# Altium schematic symbol library MCU_Microchip_ATmega.SchLib: 440 symbols (part 6 of 7) (continued)
## ATxmega128A3U-A
designator *  value ATxmega128A3U-A  Reference: U
ki_keywords: AVR 8/16bit Microcontroller XMegaAVR; ki_description: 32MHz, 128kB Flash, 8kB Boot, 8kB SRAM, 2kB EEPROM, JTAG, USB, TQFP-64; ki_fp_filters: TQFP*14x14mm*P0.8mm*; Footprint: Package_QFP:TQFP-64_14x14mm_P0.8mm; Datasheet: http://ww1.microchip.com/downloads/en/DeviceDoc/Atmel-8386-8-and-16-bit-AVR-Microcontroller-ATxmega64A3U-128A3U-192A3U-256A3U_datasheet.pdf
pins: 1 PA3, 2 PA4, 3 PA5, 4 PA6, 5 PA7, 6 AREFB/PB0, 7 PB1, 8 PB2, 9 PB3, 10 PB4, 11 PB5, 12 PB6, 13 PB7, 14 GND, 15 VCC, 16 PC0, 17 PC1, 18 PC2, 19 PC3, 20 PC4, 21 PC5, 22 PC6, 23 PC7, 24 GND hidden, 25 VCC hidden, 26 PD0, 27 PD1, 28 PD2, 29 PD3, 30 PD4, 31 PD5, 32 PD6, 33 PD7, 34 GND hidden, 35 VCC hidden, 36 PE0, 37 PE1, 38 PE2, 39 PE3, 40 PE4, 41 PE5, 42 PE6, 43 PE7, 44 GND hidden, 45 VCC hidden, 46 PF0, 47 PF1, 48 PF2, 49 PF3, 50 PF4, 51 PF5, 52 GND hidden, 53 VCC hidden, 54 PF6, 55 PF7, 56 PDI_DATA, 57 ~{{RESET}/PDI_CLK}, 58 PR0/XTAL2, 59 PR1/XTAL1, 60 GND hidden, 61 AVCC, 62 AREFA/PA0, 63 PA1, 64 PA2

## ATxmega128A3U-M
designator *  value ATxmega128A3U-M  Reference: U
ki_keywords: AVR 8/16bit Microcontroller XMegaAVR; ki_description: 32MHz, 128kB Flash, 8kB Boot, 8kB SRAM, 2kB EEPROM, JTAG, USB, QFN-64; ki_fp_filters: QFN*1EP*9x9mm*P0.5mm*; Footprint: Package_DFN_QFN:QFN-64-1EP_9x9mm_P0.5mm_EP7.65x7.65mm; Datasheet: http://ww1.microchip.com/downloads/en/DeviceDoc/Atmel-8386-8-and-16-bit-AVR-Microcontroller-ATxmega64A3U-128A3U-192A3U-256A3U_datasheet.pdf
pins: 1 PA3, 2 PA4, 3 PA5, 4 PA6, 5 PA7, 6 AREFB/PB0, 7 PB1, 8 PB2, 9 PB3, 10 PB4, 11 PB5, 12 PB6, 13 PB7, 14 GND, 15 VCC, 16 PC0, 17 PC1, 18 PC2, 19 PC3, 20 PC4, 21 PC5, 22 PC6, 23 PC7, 24 GND hidden, 25 VCC hidden, 26 PD0, 27 PD1, 28 PD2, 29 PD3, 30 PD4, 31 PD5, 32 PD6, 33 PD7, 34 GND hidden, 35 VCC hidden, 36 PE0, 37 PE1, 38 PE2, 39 PE3, 40 PE4, 41 PE5, 42 PE6, 43 PE7, 44 GND hidden, 45 VCC hidden, 46 PF0, 47 PF1, 48 PF2, 49 PF3, 50 PF4, 51 PF5, 52 GND hidden, 53 VCC hidden, 54 PF6, 55 PF7, 56 PDI_DATA, 57 ~{{RESET}/PDI_CLK}, 58 PR0/XTAL2, 59 PR1/XTAL1, 60 GND hidden, 61 AVCC, 62 AREFA/PA0, 63 PA1, 64 PA2, 65 GND hidden

## ATxmega128A4U-A
designator *  value ATxmega128A4U-A  Reference: U
ki_keywords: AVR 8/16bit Microcontroller XMegaAVR; ki_description: 32MHz, 128kB Flash, 8kB Boot, 8kB SRAM, 2kB EEPROM, JTAG, USB, TQFP-44; ki_fp_filters: TQFP*10x10mm*P0.8mm*; Footprint: Package_QFP:TQFP-44_10x10mm_P0.8mm; Datasheet: http://ww1.microchip.com/downloads/en/DeviceDoc/Atmel-8387-8-and16-bit-AVR-Microcontroller-XMEGA-A4U_Datasheet.pdf
pins: 1 PA5, 2 PA6, 3 PA7, 4 AREFB/PB0, 5 PB1, 6 PB2, 7 PB3, 8 GND, 9 VCC, 10 PC0, 11 PC1, 12 PC2, 13 PC3, 14 PC4, 15 PC5, 16 PC6, 17 PC7, 18 GND hidden, 19 VCC hidden, 20 PD0, 21 PD1, 22 PD2, 23 PD3, 24 PD4, 25 PD5, 26 PD6, 27 PD7, 28 PE0, 29 PE1, 30 GND hidden, 31 VCC hidden, 32 PE2, 33 PE3, 34 PDI_DATA, 35 ~{{RESET}/PDI_CLK}, 36 PR0/XTAL2, 37 PR1/XTAL1, 38 GND hidden, 39 AVCC, 40 AREFA/PA0, 41 PA1, 42 PA2, 43 PA3, 44 PA4

## ATxmega128A4U-C
designator *  value ATxmega128A4U-C  Reference: U
ki_keywords: AVR 8/16bit Microcontroller XMegaAVR; ki_description: 32MHz, 128kB Flash, 8kB Boot, 8kB SRAM, 2kB EEPROM, JTAG, USB, VFBGA-49; ki_fp_filters: VFBGA*5.0x5.0mm*Layout7x7*P0.65mm*; Footprint: Package_BGA:VFBGA-49_5.0x5.0mm_Layout7x7_P0.65mm; Datasheet: http://ww1.microchip.com/downloads/en/DeviceDoc/Atmel-8387-8-and16-bit-AVR-Microcontroller-XMEGA-A4U_Datasheet.pdf
pins: A1 PA3, A2 AVCC, A3 GND, A4 PR1/XTAL1, A5 PR0/XTAL2, A6 PDI_DATA, A7 PE3, B1 PA4, B2 PA1, B3 AREFA/PA0, B4 GND hidden, B5 ~{{RESET}/PDI_CLK}, B6 PE2, B7 VCC, C1 PA5, C2 PA2, C3 PA6, C4 PA7, C5 GND hidden, C6 PE1, C7 GND hidden, D1 PB1, D2 PB2, D3 PB3, D4 AREFB/PB0, D5 GND hidden, D6 PD7, D7 PE0, E1 GND hidden, E2 GND hidden, E3 PC3, E4 GND hidden, E5 PD4, E6 PD5, E7 PD6, F1 VCC hidden, F2 PC0, F3 PC4, F4 PC6, F5 PD0, F6 PD1, F7 PD3, G1 PC1, G2 PC2, G3 PC5, G4 PC7, G5 GND hidden, G6 VCC hidden, G7 PD2

## ATxmega128A4U-M
designator *  value ATxmega128A4U-M  Reference: U
ki_keywords: AVR 8/16bit Microcontroller XMegaAVR; ki_description: 32MHz, 128kB Flash, 8kB Boot, 8kB SRAM, 2kB EEPROM, JTAG, USB, QFN-44; ki_fp_filters: QFN*1EP*7x7mm*P0.5mm*; Footprint: Package_DFN_QFN:QFN-44-1EP_7x7mm_P0.5mm_EP5.2x5.2mm; Datasheet: http://ww1.microchip.com/downloads/en/DeviceDoc/Atmel-8387-8-and16-bit-AVR-Microcontroller-XMEGA-A4U_Datasheet.pdf
pins: 1 PA5, 2 PA6, 3 PA7, 4 AREFB/PB0, 5 PB1, 6 PB2, 7 PB3, 8 GND, 9 VCC, 10 PC0, 11 PC1, 12 PC2, 13 PC3, 14 PC4, 15 PC5, 16 PC6, 17 PC7, 18 GND hidden, 19 VCC hidden, 20 PD0, 21 PD1, 22 PD2, 23 PD3, 24 PD4, 25 PD5, 26 PD6, 27 PD7, 28 PE0, 29 PE1, 30 GND hidden, 31 VCC hidden, 32 PE2, 33 PE3, 34 PDI_DATA, 35 ~{{RESET}/PDI_CLK}, 36 PR0/XTAL2, 37 PR1/XTAL1, 38 GND hidden, 39 AVCC, 40 AREFA/PA0, 41 PA1, 42 PA2, 43 PA3, 44 PA4, 45 GND hidden

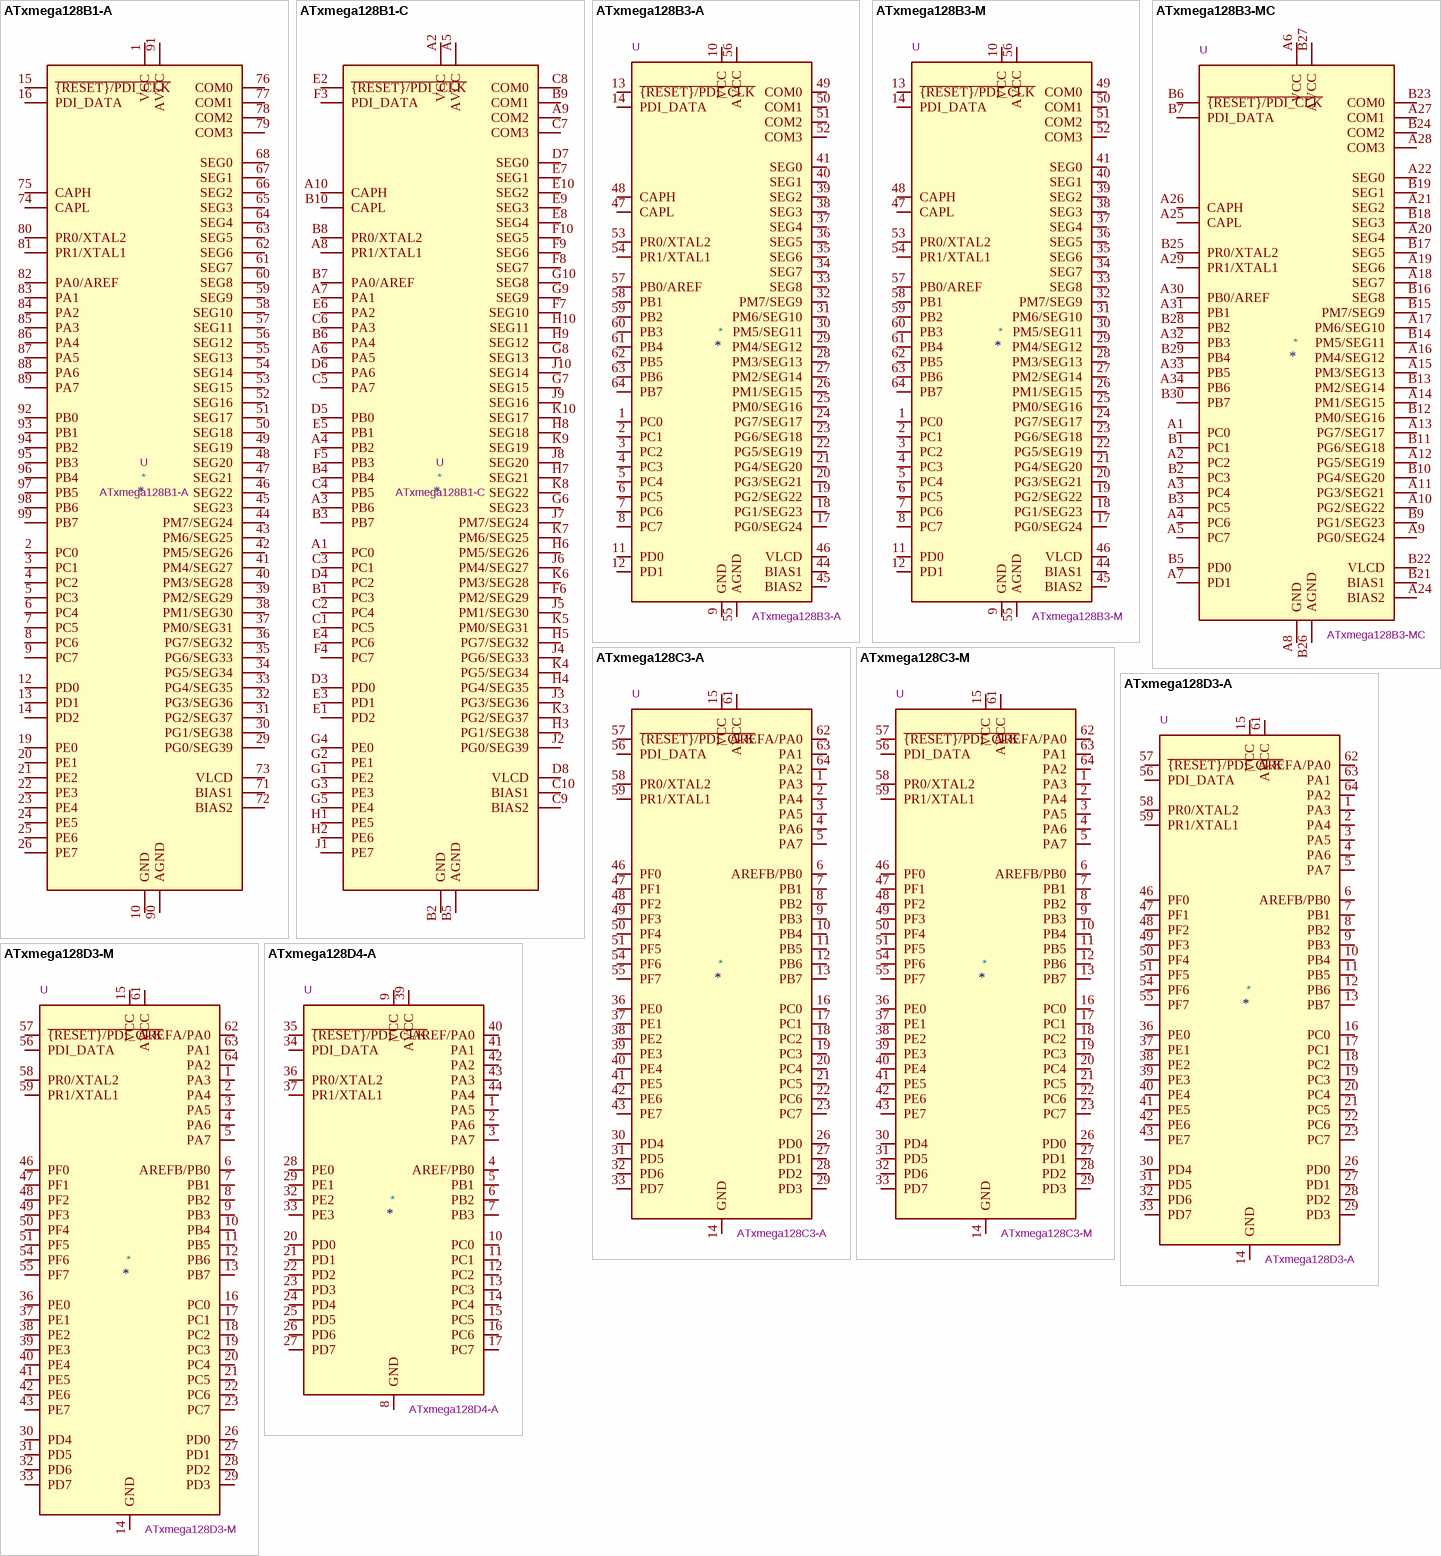
[diagram p37: symbols ATxmega128B1-A to ATxmega128D4-A]

## ATxmega128B1-A
designator *  value ATxmega128B1-A  Reference: U
ki_keywords: AVR 8/16bit Microcontroller XMegaAVR; ki_description: 32MHz, 128kB Flash, 8kB Boot, 8kB SRAM, 2kB EEPROM, JTAG, USB, LCD, TQFP-100; ki_fp_filters: TQFP*14x14mm*P0.5mm*; Footprint: Package_QFP:TQFP-100_14x14mm_P0.5mm; Datasheet: http://ww1.microchip.com/downloads/en/DeviceDoc/Atmel-8330-8-and-16-bit-AVR-Microcontroller-XMEGA-B-ATxmega64B1-ATxmega128B1_Datasheet.pdf
pins: 1 VCC, 2 PC0, 3 PC1, 4 PC2, 5 PC3, 6 PC4, 7 PC5, 8 PC6, 9 PC7, 10 GND, 11 VCC hidden, 12 PD0, 13 PD1, 14 PD2, 15 ~{{RESET}/PDI_CLK}, 16 PDI_DATA, 17 GND hidden, 18 VCC hidden, 19 PE0, 20 PE1, 21 PE2, 22 PE3, 23 PE4, 24 PE5, 25 PE6, 26 PE7, 27 GND hidden, 28 VCC hidden, 29 PG0/SEG39, 30 PG1/SEG38, 31 PG2/SEG37, 32 PG3/SEG36, 33 PG4/SEG35, 34 PG5/SEG34, 35 PG6/SEG33, 36 PG7/SEG32, 37 PM0/SEG31, 38 PM1/SEG30, 39 PM2/SEG29, 40 PM3/SEG28, 41 PM4/SEG27, 42 PM5/SEG26, 43 PM6/SEG25, 44 PM7/SEG24, 45 SEG23, 46 SEG22, 47 SEG21, 48 SEG20, 49 SEG19, 50 SEG18, 51 SEG17, 52 SEG16, 53 SEG15, 54 SEG14, 55 SEG13, 56 SEG12, 57 SEG11, 58 SEG10, 59 SEG9, 60 SEG8, 61 SEG7, 62 SEG6, 63 SEG5, 64 SEG4, 65 SEG3, 66 SEG2, 67 SEG1, 68 SEG0, 69 GND hidden, 70 VCC hidden, 71 BIAS1, 72 BIAS2, 73 VLCD, 74 CAPL, 75 CAPH, 76 COM0, 77 COM1, 78 COM2, 79 COM3, 80 PR0/XTAL2, 81 PR1/XTAL1, 82 PA0/AREF, 83 PA1, 84 PA2, 85 PA3, 86 PA4, 87 PA5, 88 PA6, 89 PA7, 90 AGND, 91 AVCC, 92 PB0, 93 PB1, 94 PB2, 95 PB3, 96 PB4, 97 PB5, 98 PB6, 99 PB7, 100 GND hidden

## ATxmega128B1-C
designator *  value ATxmega128B1-C  Reference: U
ki_keywords: AVR 8/16bit Microcontroller XMegaAVR; ki_description: 32MHz, 128kB Flash, 8kB Boot, 8kB SRAM, 2kB EEPROM, JTAG, USB, LCD, VFBGA-100; ki_fp_filters: VFBGA*7.0x7.0mm*Layout10x10*P0.65mm*; Footprint: Package_BGA:VFBGA-100_7.0x7.0mm_Layout10x10_P0.65mm; Datasheet: http://ww1.microchip.com/downloads/en/DeviceDoc/Atmel-8330-8-and-16-bit-AVR-Microcontroller-XMEGA-B-ATxmega64B1-ATxmega128B1_Datasheet.pdf
pins: A1 PC0, A2 VCC, A3 PB6, A4 PB2, A5 AVCC, A6 PA5, A7 PA1, A8 PR1/XTAL1, A9 COM2, A10 CAPH, B1 PC3, B2 GND, B3 PB7, B4 PB4, B5 AGND, B6 PA4, B7 PA0/AREF, B8 PR0/XTAL2, B9 COM1, B10 CAPL, C1 PC5, C2 PC4, C3 PC1, C4 PB5, C5 PA7, C6 PA3, C7 COM3, C8 COM0, C9 BIAS2, C10 BIAS1, D1 VCC hidden, D2 GND hidden, D3 PD0, D4 PC2, D5 PB0, D6 PA6, D7 SEG0, D8 VLCD, D9 GND hidden, D10 VCC hidden, E1 PD2, E2 ~{{RESET}/PDI_CLK}, E3 PD1, E4 PC6, E5 PB1, E6 PA2, E7 SEG1, E8 SEG4, E9 SEG3, E10 SEG2, F1 VCC hidden, F2 GND hidden, F3 PDI_DATA, F4 PC7, F5 PB3, F6 PM2/SEG29, F7 SEG10, F8 SEG7, F9 SEG6, F10 SEG5, G1 PE2, G2 PE1, G3 PE3, G4 PE0, G5 PE4, G6 SEG23, G7 SEG15, G8 SEG13, G9 SEG9, G10 SEG8, H1 PE5, H2 PE6, H3 PG1/SEG38, H4 PG4/SEG35, H5 PG7/SEG32, H6 PM5/SEG26, H7 SEG21, H8 SEG18, H9 SEG12, H10 SEG11, J1 PE7, J2 PG0/SEG39, J3 PG3/SEG36, J4 PG6/SEG33, J5 PM1/SEG30, J6 PM4/SEG27, J7 PM7/SEG24, J8 SEG20, J9 SEG16, J10 SEG14, K1 GND hidden, K2 VCC hidden, K3 PG2/SEG37, K4 PG5/SEG34, K5 PM0/SEG31, K6 PM3/SEG28, K7 PM6/SEG25, K8 SEG22, K9 SEG19, K10 SEG17

## ATxmega128B3-A
designator *  value ATxmega128B3-A  Reference: U
ki_keywords: AVR 8/16bit Microcontroller XMegaAVR; ki_description: 32MHz, 128kB Flash, 8kB Boot, 8kB SRAM, 2kB EEPROM, JTAG, USB, LCD, TQFP-64; ki_fp_filters: TQFP*14x14mm*P0.8mm*; Footprint: Package_QFP:TQFP-64_14x14mm_P0.8mm; Datasheet: http://ww1.microchip.com/downloads/en/DeviceDoc/Atmel-8074-8-and-16-bit-AVR-Microcontroller-XMEGA-B-ATxmega64B3-ATxmega128B3_Datasheet.pdf
pins: 1 PC0, 2 PC1, 3 PC2, 4 PC3, 5 PC4, 6 PC5, 7 PC6, 8 PC7, 9 GND, 10 VCC, 11 PD0, 12 PD1, 13 ~{{RESET}/PDI_CLK}, 14 PDI_DATA, 15 GND hidden, 16 VCC hidden, 17 PG0/SEG24, 18 PG1/SEG23, 19 PG2/SEG22, 20 PG3/SEG21, 21 PG4/SEG20, 22 PG5/SEG19, 23 PG6/SEG18, 24 PG7/SEG17, 25 PM0/SEG16, 26 PM1/SEG15, 27 PM2/SEG14, 28 PM3/SEG13, 29 PM4/SEG12, 30 PM5/SEG11, 31 PM6/SEG10, 32 PM7/SEG9, 33 SEG8, 34 SEG7, 35 SEG6, 36 SEG5, 37 SEG4, 38 SEG3, 39 SEG2, 40 SEG1, 41 SEG0, 42 GND hidden, 43 VCC hidden, 44 BIAS1, 45 BIAS2, 46 VLCD, 47 CAPL, 48 CAPH, 49 COM0, 50 COM1, 51 COM2, 52 COM3, 53 PR0/XTAL2, 54 PR1/XTAL1, 55 AGND, 56 AVCC, 57 PB0/AREF, 58 PB1, 59 PB2, 60 PB3, 61 PB4, 62 PB5, 63 PB6, 64 PB7

## ATxmega128B3-M
designator *  value ATxmega128B3-M  Reference: U
ki_keywords: AVR 8/16bit Microcontroller XMegaAVR; ki_description: 32MHz, 128kB Flash, 8kB Boot, 8kB SRAM, 2kB EEPROM, JTAG, USB, LCD, QFN-64; ki_fp_filters: QFN*1EP*9x9mm*P0.5mm*; Footprint: Package_DFN_QFN:QFN-64-1EP_9x9mm_P0.5mm_EP7.65x7.65mm; Datasheet: http://ww1.microchip.com/downloads/en/DeviceDoc/Atmel-8074-8-and-16-bit-AVR-Microcontroller-XMEGA-B-ATxmega64B3-ATxmega128B3_Datasheet.pdf
pins: 1 PC0, 2 PC1, 3 PC2, 4 PC3, 5 PC4, 6 PC5, 7 PC6, 8 PC7, 9 GND, 10 VCC, 11 PD0, 12 PD1, 13 ~{{RESET}/PDI_CLK}, 14 PDI_DATA, 15 GND hidden, 16 VCC hidden, 17 PG0/SEG24, 18 PG1/SEG23, 19 PG2/SEG22, 20 PG3/SEG21, 21 PG4/SEG20, 22 PG5/SEG19, 23 PG6/SEG18, 24 PG7/SEG17, 25 PM0/SEG16, 26 PM1/SEG15, 27 PM2/SEG14, 28 PM3/SEG13, 29 PM4/SEG12, 30 PM5/SEG11, 31 PM6/SEG10, 32 PM7/SEG9, 33 SEG8, 34 SEG7, 35 SEG6, 36 SEG5, 37 SEG4, 38 SEG3, 39 SEG2, 40 SEG1, 41 SEG0, 42 GND hidden, 43 VCC hidden, 44 BIAS1, 45 BIAS2, 46 VLCD, 47 CAPL, 48 CAPH, 49 COM0, 50 COM1, 51 COM2, 52 COM3, 53 PR0/XTAL2, 54 PR1/XTAL1, 55 AGND, 56 AVCC, 57 PB0/AREF, 58 PB1, 59 PB2, 60 PB3, 61 PB4, 62 PB5, 63 PB6, 64 PB7, 65 GND hidden

## ATxmega128B3-MC
designator *  value ATxmega128B3-MC  Reference: U
ki_keywords: AVR 8/16bit Microcontroller XMegaAVR; ki_description: 32MHz, 128kB Flash, 8kB Boot, 8kB SRAM, 2kB EEPROM, JTAG, USB, LCD, DRQFN-64; ki_fp_filters: Microchip*DRQFN*1EP*7x7mm*P0.65mm*; Footprint: Package_DFN_QFN:Microchip_DRQFN-64-1EP_7x7mm_P0.65mm_EP4.1x4.1mm; Datasheet: http://ww1.microchip.com/downloads/en/DeviceDoc/Atmel-8074-8-and-16-bit-AVR-Microcontroller-XMEGA-B-ATxmega64B3-ATxmega128B3_Datasheet.pdf
pins: A1 PC0, A2 PC2, A3 PC4, A4 PC6, A5 PC7, A6 VCC, A7 PD1, A8 GND, A9 PG0/SEG24, A10 PG2/SEG22, A11 PG3/SEG21, A12 PG5/SEG19, A13 PG7/SEG17, A14 PM1/SEG15, A15 PM3/SEG13, A16 PM4/SEG12, A17 PM6/SEG10, A18 SEG7, A19 SEG6, A20 SEG4, A21 SEG2, A22 SEG0, A23 VCC hidden, A24 BIAS2, A25 CAPL, A26 CAPH, A27 COM1, A28 COM3, A29 PR1/XTAL1, A30 PB0/AREF, A31 PB1, A32 PB3, A33 PB5, A34 PB6, B1 PC1, B2 PC3, B3 PC5, B4 GND hidden, B5 PD0, B6 ~{{RESET}/PDI_CLK}, B7 PDI_DATA, B8 VCC hidden, B9 PG1/SEG23, B10 PG4/SEG20, B11 PG6/SEG18, B12 PM0/SEG16, B13 PM2/SEG14, B14 PM5/SEG11, B15 PM7/SEG9, B16 SEG8, B17 SEG5, B18 SEG3, B19 SEG1, B20 GND hidden, B21 BIAS1, B22 VLCD, B23 COM0, B24 COM2, B25 PR0/XTAL2, B26 AGND, B27 AVCC, B28 PB2, B29 PB4, B30 PB7, EP GND hidden

## ATxmega128C3-A
designator *  value ATxmega128C3-A  Reference: U
ki_keywords: AVR 8/16bit Microcontroller XMegaAVR; ki_description: 32MHz, 128kB Flash, 8kB Boot, 8kB SRAM, 2kB EEPROM, JTAG, USB, TQFP-64; ki_fp_filters: TQFP*14x14mm*P0.8mm*; Footprint: Package_QFP:TQFP-64_14x14mm_P0.8mm; Datasheet: http://ww1.microchip.com/downloads/en/DeviceDoc/Atmel-8492-8-and-16-bit-AVR-microcontroller-ATxmega32C3_64C3_128C3_192C3_256C3_datasheet.pdf
pins: 1 PA3, 2 PA4, 3 PA5, 4 PA6, 5 PA7, 6 AREFB/PB0, 7 PB1, 8 PB2, 9 PB3, 10 PB4, 11 PB5, 12 PB6, 13 PB7, 14 GND, 15 VCC, 16 PC0, 17 PC1, 18 PC2, 19 PC3, 20 PC4, 21 PC5, 22 PC6, 23 PC7, 24 GND hidden, 25 VCC hidden, 26 PD0, 27 PD1, 28 PD2, 29 PD3, 30 PD4, 31 PD5, 32 PD6, 33 PD7, 34 GND hidden, 35 VCC hidden, 36 PE0, 37 PE1, 38 PE2, 39 PE3, 40 PE4, 41 PE5, 42 PE6, 43 PE7, 44 GND hidden, 45 VCC hidden, 46 PF0, 47 PF1, 48 PF2, 49 PF3, 50 PF4, 51 PF5, 52 GND hidden, 53 VCC hidden, 54 PF6, 55 PF7, 56 PDI_DATA, 57 ~{{RESET}/PDI_CLK}, 58 PR0/XTAL2, 59 PR1/XTAL1, 60 GND hidden, 61 AVCC, 62 AREFA/PA0, 63 PA1, 64 PA2

## ATxmega128C3-M
designator *  value ATxmega128C3-M  Reference: U
ki_keywords: AVR 8/16bit Microcontroller XMegaAVR; ki_description: 32MHz, 128kB Flash, 8kB Boot, 8kB SRAM, 2kB EEPROM, JTAG, USB, QFN-64; ki_fp_filters: QFN*1EP*9x9mm*P0.5mm*; Footprint: Package_DFN_QFN:QFN-64-1EP_9x9mm_P0.5mm_EP7.65x7.65mm; Datasheet: http://ww1.microchip.com/downloads/en/DeviceDoc/Atmel-8492-8-and-16-bit-AVR-microcontroller-ATxmega32C3_64C3_128C3_192C3_256C3_datasheet.pdf
pins: 1 PA3, 2 PA4, 3 PA5, 4 PA6, 5 PA7, 6 AREFB/PB0, 7 PB1, 8 PB2, 9 PB3, 10 PB4, 11 PB5, 12 PB6, 13 PB7, 14 GND, 15 VCC, 16 PC0, 17 PC1, 18 PC2, 19 PC3, 20 PC4, 21 PC5, 22 PC6, 23 PC7, 24 GND hidden, 25 VCC hidden, 26 PD0, 27 PD1, 28 PD2, 29 PD3, 30 PD4, 31 PD5, 32 PD6, 33 PD7, 34 GND hidden, 35 VCC hidden, 36 PE0, 37 PE1, 38 PE2, 39 PE3, 40 PE4, 41 PE5, 42 PE6, 43 PE7, 44 GND hidden, 45 VCC hidden, 46 PF0, 47 PF1, 48 PF2, 49 PF3, 50 PF4, 51 PF5, 52 GND hidden, 53 VCC hidden, 54 PF6, 55 PF7, 56 PDI_DATA, 57 ~{{RESET}/PDI_CLK}, 58 PR0/XTAL2, 59 PR1/XTAL1, 60 GND hidden, 61 AVCC, 62 AREFA/PA0, 63 PA1, 64 PA2, 65 GND hidden

## ATxmega128D3-A
designator *  value ATxmega128D3-A  Reference: U
ki_keywords: AVR 8/16bit Microcontroller XMegaAVR; ki_description: 32MHz, 128kB Flash, 8kB Boot, 8kB SRAM, 2kB EEPROM, JTAG, TQFP-64; ki_fp_filters: TQFP*14x14mm*P0.8mm*; Footprint: Package_QFP:TQFP-64_14x14mm_P0.8mm; Datasheet: http://ww1.microchip.com/downloads/en/DeviceDoc/Atmel-8134-8-16-bit-Atmel-XMEGA-D3-Microcontroller_Datasheet.pdf
pins: 1 PA3, 2 PA4, 3 PA5, 4 PA6, 5 PA7, 6 AREFB/PB0, 7 PB1, 8 PB2, 9 PB3, 10 PB4, 11 PB5, 12 PB6, 13 PB7, 14 GND, 15 VCC, 16 PC0, 17 PC1, 18 PC2, 19 PC3, 20 PC4, 21 PC5, 22 PC6, 23 PC7, 24 GND hidden, 25 VCC hidden, 26 PD0, 27 PD1, 28 PD2, 29 PD3, 30 PD4, 31 PD5, 32 PD6, 33 PD7, 34 GND hidden, 35 VCC hidden, 36 PE0, 37 PE1, 38 PE2, 39 PE3, 40 PE4, 41 PE5, 42 PE6, 43 PE7, 44 GND hidden, 45 VCC hidden, 46 PF0, 47 PF1, 48 PF2, 49 PF3, 50 PF4, 51 PF5, 52 GND hidden, 53 VCC hidden, 54 PF6, 55 PF7, 56 PDI_DATA, 57 ~{{RESET}/PDI_CLK}, 58 PR0/XTAL2, 59 PR1/XTAL1, 60 GND hidden, 61 AVCC, 62 AREFA/PA0, 63 PA1, 64 PA2

## ATxmega128D3-M
designator *  value ATxmega128D3-M  Reference: U
ki_keywords: AVR 8/16bit Microcontroller XMegaAVR; ki_description: 32MHz, 128kB Flash, 8kB Boot, 8kB SRAM, 2kB EEPROM, JTAG, QFN-64; ki_fp_filters: QFN*1EP*9x9mm*P0.5mm*; Footprint: Package_DFN_QFN:QFN-64-1EP_9x9mm_P0.5mm_EP7.65x7.65mm; Datasheet: http://ww1.microchip.com/downloads/en/DeviceDoc/Atmel-8134-8-16-bit-Atmel-XMEGA-D3-Microcontroller_Datasheet.pdf
pins: 1 PA3, 2 PA4, 3 PA5, 4 PA6, 5 PA7, 6 AREFB/PB0, 7 PB1, 8 PB2, 9 PB3, 10 PB4, 11 PB5, 12 PB6, 13 PB7, 14 GND, 15 VCC, 16 PC0, 17 PC1, 18 PC2, 19 PC3, 20 PC4, 21 PC5, 22 PC6, 23 PC7, 24 GND hidden, 25 VCC hidden, 26 PD0, 27 PD1, 28 PD2, 29 PD3, 30 PD4, 31 PD5, 32 PD6, 33 PD7, 34 GND hidden, 35 VCC hidden, 36 PE0, 37 PE1, 38 PE2, 39 PE3, 40 PE4, 41 PE5, 42 PE6, 43 PE7, 44 GND hidden, 45 VCC hidden, 46 PF0, 47 PF1, 48 PF2, 49 PF3, 50 PF4, 51 PF5, 52 GND hidden, 53 VCC hidden, 54 PF6, 55 PF7, 56 PDI_DATA, 57 ~{{RESET}/PDI_CLK}, 58 PR0/XTAL2, 59 PR1/XTAL1, 60 GND hidden, 61 AVCC, 62 AREFA/PA0, 63 PA1, 64 PA2, 65 GND hidden

## ATxmega128D4-A
designator *  value ATxmega128D4-A  Reference: U
ki_keywords: AVR 8/16bit Microcontroller XMegaAVR; ki_description: 32MHz, 128kB Flash, 8kB Boot, 8kB SRAM, 2kB EEPROM, JTAG, TQFP-44; ki_fp_filters: TQFP*10x10mm*P0.8mm*; Footprint: Package_QFP:TQFP-44_10x10mm_P0.8mm; Datasheet: http://ww1.microchip.com/downloads/en/DeviceDoc/Atmel-8135-8-and-16-bit-AVR-microcontroller-ATxmega16D4-32D4-64D4-128D4_datasheet.pdf
pins: 1 PA5, 2 PA6, 3 PA7, 4 AREF/PB0, 5 PB1, 6 PB2, 7 PB3, 8 GND, 9 VCC, 10 PC0, 11 PC1, 12 PC2, 13 PC3, 14 PC4, 15 PC5, 16 PC6, 17 PC7, 18 GND hidden, 19 VCC hidden, 20 PD0, 21 PD1, 22 PD2, 23 PD3, 24 PD4, 25 PD5, 26 PD6, 27 PD7, 28 PE0, 29 PE1, 30 GND hidden, 31 VCC hidden, 32 PE2, 33 PE3, 34 PDI_DATA, 35 ~{{RESET}/PDI_CLK}, 36 PR0/XTAL2, 37 PR1/XTAL1, 38 GND hidden, 39 AVCC, 40 AREF/PA0, 41 PA1, 42 PA2, 43 PA3, 44 PA4

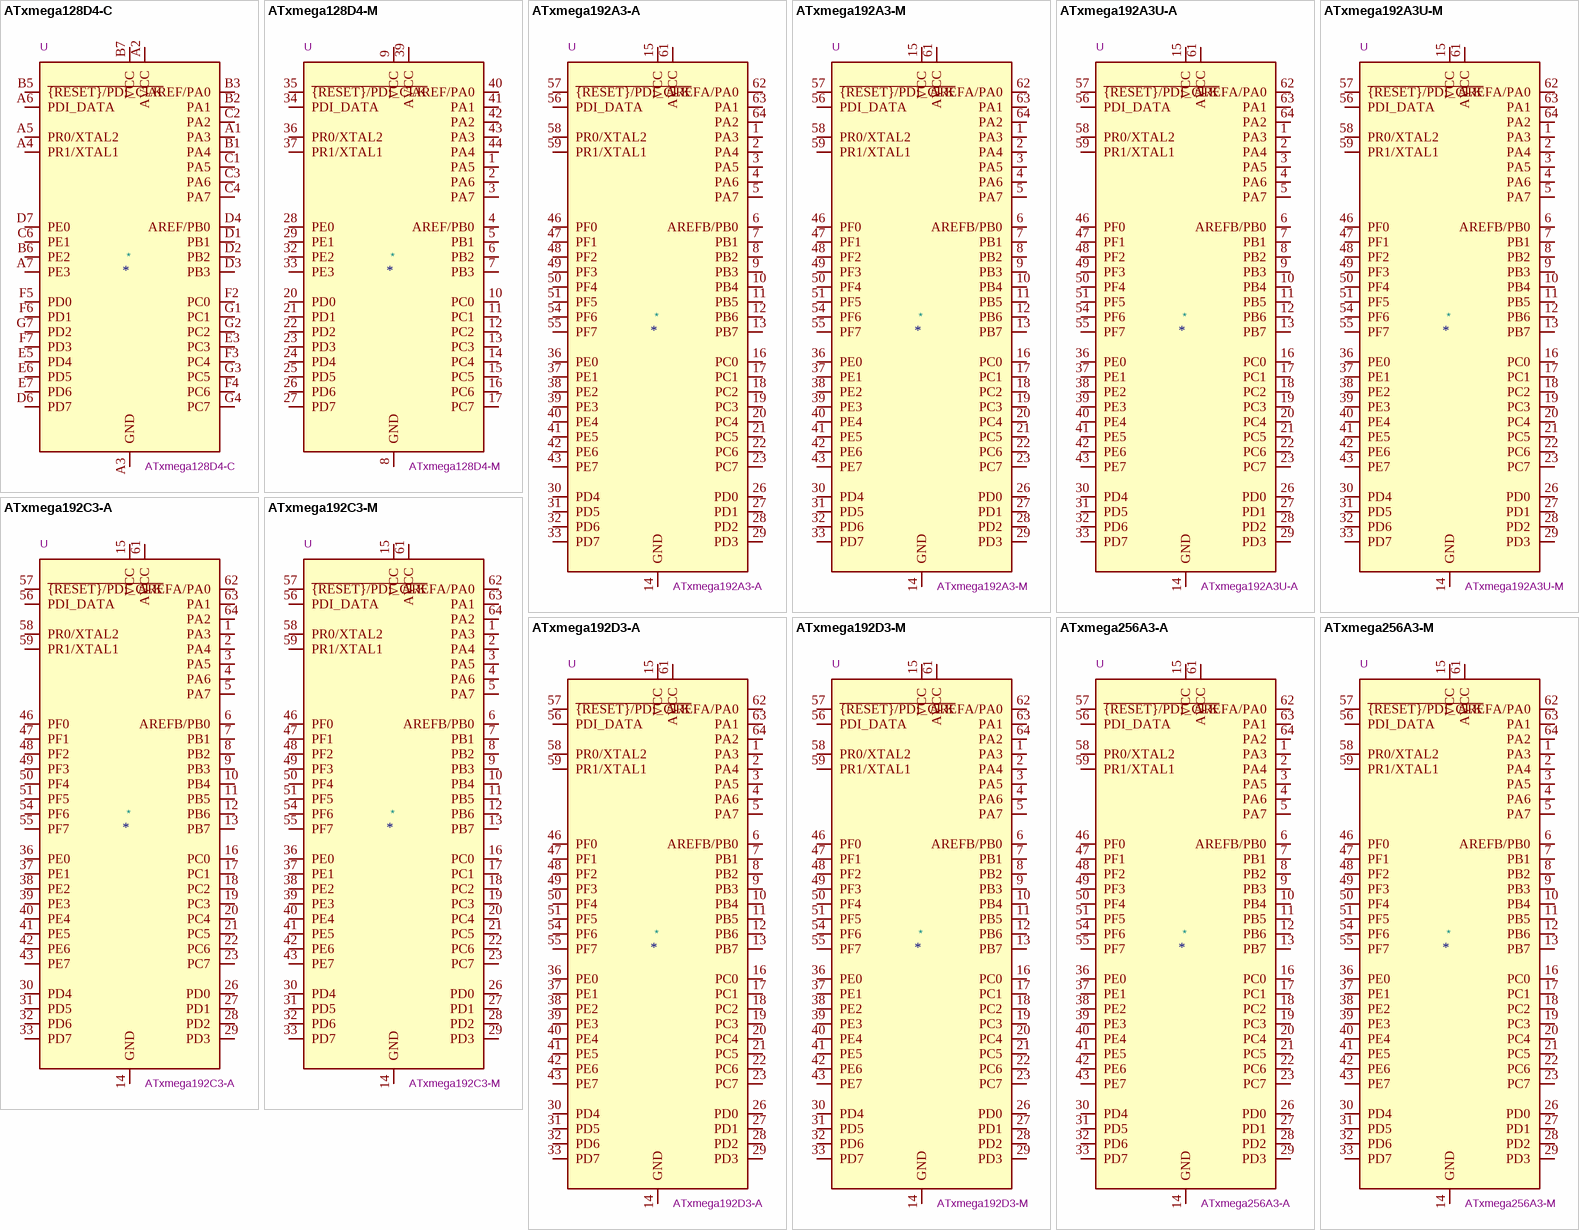
[diagram p38: symbols ATxmega128D4-C to ATxmega256A3-M]

## ATxmega128D4-C
designator *  value ATxmega128D4-C  Reference: U
ki_keywords: AVR 8/16bit Microcontroller XMegaAVR; ki_description: 32MHz, 128kB Flash, 8kB Boot, 8kB SRAM, 2kB EEPROM, JTAG, VFBGA-49; ki_fp_filters: VFBGA*5.0x5.0mm*Layout7x7*P0.65mm*; Footprint: Package_BGA:VFBGA-49_5.0x5.0mm_Layout7x7_P0.65mm; Datasheet: http://ww1.microchip.com/downloads/en/DeviceDoc/Atmel-8135-8-and-16-bit-AVR-microcontroller-ATxmega16D4-32D4-64D4-128D4_datasheet.pdf
pins: A1 PA3, A2 AVCC, A3 GND, A4 PR1/XTAL1, A5 PR0/XTAL2, A6 PDI_DATA, A7 PE3, B1 PA4, B2 PA1, B3 AREF/PA0, B4 GND hidden, B5 ~{{RESET}/PDI_CLK}, B6 PE2, B7 VCC, C1 PA5, C2 PA2, C3 PA6, C4 PA7, C5 GND hidden, C6 PE1, C7 GND hidden, D1 PB1, D2 PB2, D3 PB3, D4 AREF/PB0, D5 GND hidden, D6 PD7, D7 PE0, E1 GND hidden, E2 GND hidden, E3 PC3, E4 GND hidden, E5 PD4, E6 PD5, E7 PD6, F1 VCC hidden, F2 PC0, F3 PC4, F4 PC6, F5 PD0, F6 PD1, F7 PD3, G1 PC1, G2 PC2, G3 PC5, G4 PC7, G5 GND hidden, G6 VCC hidden, G7 PD2

## ATxmega128D4-M
designator *  value ATxmega128D4-M  Reference: U
ki_keywords: AVR 8/16bit Microcontroller XMegaAVR; ki_description: 32MHz, 128kB Flash, 8kB Boot, 8kB SRAM, 2kB EEPROM, JTAG, QFN-44; ki_fp_filters: QFN*1EP*7x7mm*P0.5mm*; Footprint: Package_DFN_QFN:QFN-44-1EP_7x7mm_P0.5mm_EP5.2x5.2mm; Datasheet: http://ww1.microchip.com/downloads/en/DeviceDoc/Atmel-8135-8-and-16-bit-AVR-microcontroller-ATxmega16D4-32D4-64D4-128D4_datasheet.pdf
pins: 1 PA5, 2 PA6, 3 PA7, 4 AREF/PB0, 5 PB1, 6 PB2, 7 PB3, 8 GND, 9 VCC, 10 PC0, 11 PC1, 12 PC2, 13 PC3, 14 PC4, 15 PC5, 16 PC6, 17 PC7, 18 GND hidden, 19 VCC hidden, 20 PD0, 21 PD1, 22 PD2, 23 PD3, 24 PD4, 25 PD5, 26 PD6, 27 PD7, 28 PE0, 29 PE1, 30 GND hidden, 31 VCC hidden, 32 PE2, 33 PE3, 34 PDI_DATA, 35 ~{{RESET}/PDI_CLK}, 36 PR0/XTAL2, 37 PR1/XTAL1, 38 GND hidden, 39 AVCC, 40 AREF/PA0, 41 PA1, 42 PA2, 43 PA3, 44 PA4, 45 GND hidden

## ATxmega192A3-A
designator *  value ATxmega192A3-A  Reference: U
ki_keywords: AVR 8/16bit Microcontroller XMegaAVR; ki_description: 32MHz, 192kB Flash, 8kB Boot, 16kB SRAM, 2kB EEPROM, JTAG, TQFP-64; ki_fp_filters: TQFP*14x14mm*P0.8mm*; Footprint: Package_QFP:TQFP-64_14x14mm_P0.8mm; Datasheet: http://ww1.microchip.com/downloads/en/DeviceDoc/Atmel-8068-8-and16-bit-AVR-XMEGA-A3-Microcontrollers_Datasheet.pdf
pins: 1 PA3, 2 PA4, 3 PA5, 4 PA6, 5 PA7, 6 AREFB/PB0, 7 PB1, 8 PB2, 9 PB3, 10 PB4, 11 PB5, 12 PB6, 13 PB7, 14 GND, 15 VCC, 16 PC0, 17 PC1, 18 PC2, 19 PC3, 20 PC4, 21 PC5, 22 PC6, 23 PC7, 24 GND hidden, 25 VCC hidden, 26 PD0, 27 PD1, 28 PD2, 29 PD3, 30 PD4, 31 PD5, 32 PD6, 33 PD7, 34 GND hidden, 35 VCC hidden, 36 PE0, 37 PE1, 38 PE2, 39 PE3, 40 PE4, 41 PE5, 42 PE6, 43 PE7, 44 GND hidden, 45 VCC hidden, 46 PF0, 47 PF1, 48 PF2, 49 PF3, 50 PF4, 51 PF5, 52 GND hidden, 53 VCC hidden, 54 PF6, 55 PF7, 56 PDI_DATA, 57 ~{{RESET}/PDI_CLK}, 58 PR0/XTAL2, 59 PR1/XTAL1, 60 GND hidden, 61 AVCC, 62 AREFA/PA0, 63 PA1, 64 PA2

## ATxmega192A3-M
designator *  value ATxmega192A3-M  Reference: U
ki_keywords: AVR 8/16bit Microcontroller XMegaAVR; ki_description: 32MHz, 192kB Flash, 8kB Boot, 16kB SRAM, 2kB EEPROM, JTAG, QFN-64; ki_fp_filters: QFN*1EP*9x9mm*P0.5mm*; Footprint: Package_DFN_QFN:QFN-64-1EP_9x9mm_P0.5mm_EP7.65x7.65mm; Datasheet: http://ww1.microchip.com/downloads/en/DeviceDoc/Atmel-8068-8-and16-bit-AVR-XMEGA-A3-Microcontrollers_Datasheet.pdf
pins: 1 PA3, 2 PA4, 3 PA5, 4 PA6, 5 PA7, 6 AREFB/PB0, 7 PB1, 8 PB2, 9 PB3, 10 PB4, 11 PB5, 12 PB6, 13 PB7, 14 GND, 15 VCC, 16 PC0, 17 PC1, 18 PC2, 19 PC3, 20 PC4, 21 PC5, 22 PC6, 23 PC7, 24 GND hidden, 25 VCC hidden, 26 PD0, 27 PD1, 28 PD2, 29 PD3, 30 PD4, 31 PD5, 32 PD6, 33 PD7, 34 GND hidden, 35 VCC hidden, 36 PE0, 37 PE1, 38 PE2, 39 PE3, 40 PE4, 41 PE5, 42 PE6, 43 PE7, 44 GND hidden, 45 VCC hidden, 46 PF0, 47 PF1, 48 PF2, 49 PF3, 50 PF4, 51 PF5, 52 GND hidden, 53 VCC hidden, 54 PF6, 55 PF7, 56 PDI_DATA, 57 ~{{RESET}/PDI_CLK}, 58 PR0/XTAL2, 59 PR1/XTAL1, 60 GND hidden, 61 AVCC, 62 AREFA/PA0, 63 PA1, 64 PA2, 65 GND hidden

## ATxmega192A3U-A
designator *  value ATxmega192A3U-A  Reference: U
ki_keywords: AVR 8/16bit Microcontroller XMegaAVR; ki_description: 32MHz, 192kB Flash, 8kB Boot, 16kB SRAM, 2kB EEPROM, JTAG, USB, TQFP-64; ki_fp_filters: TQFP*14x14mm*P0.8mm*; Footprint: Package_QFP:TQFP-64_14x14mm_P0.8mm; Datasheet: http://ww1.microchip.com/downloads/en/DeviceDoc/Atmel-8386-8-and-16-bit-AVR-Microcontroller-ATxmega64A3U-128A3U-192A3U-256A3U_datasheet.pdf
pins: 1 PA3, 2 PA4, 3 PA5, 4 PA6, 5 PA7, 6 AREFB/PB0, 7 PB1, 8 PB2, 9 PB3, 10 PB4, 11 PB5, 12 PB6, 13 PB7, 14 GND, 15 VCC, 16 PC0, 17 PC1, 18 PC2, 19 PC3, 20 PC4, 21 PC5, 22 PC6, 23 PC7, 24 GND hidden, 25 VCC hidden, 26 PD0, 27 PD1, 28 PD2, 29 PD3, 30 PD4, 31 PD5, 32 PD6, 33 PD7, 34 GND hidden, 35 VCC hidden, 36 PE0, 37 PE1, 38 PE2, 39 PE3, 40 PE4, 41 PE5, 42 PE6, 43 PE7, 44 GND hidden, 45 VCC hidden, 46 PF0, 47 PF1, 48 PF2, 49 PF3, 50 PF4, 51 PF5, 52 GND hidden, 53 VCC hidden, 54 PF6, 55 PF7, 56 PDI_DATA, 57 ~{{RESET}/PDI_CLK}, 58 PR0/XTAL2, 59 PR1/XTAL1, 60 GND hidden, 61 AVCC, 62 AREFA/PA0, 63 PA1, 64 PA2